# Altium footprint library my Library.PcbLib: 1247 footprints (part 72 of 78)
Each footprint in its own frame and in the unit in brackets; x right, y up, seen from the top. Pads: shape width x height; smd on the part's side, far side on the other; paste and mask are expansions set on the pad; w line width, h text height; cw(c..) or ccw(c..) is an arc to the next point about the centre after c.
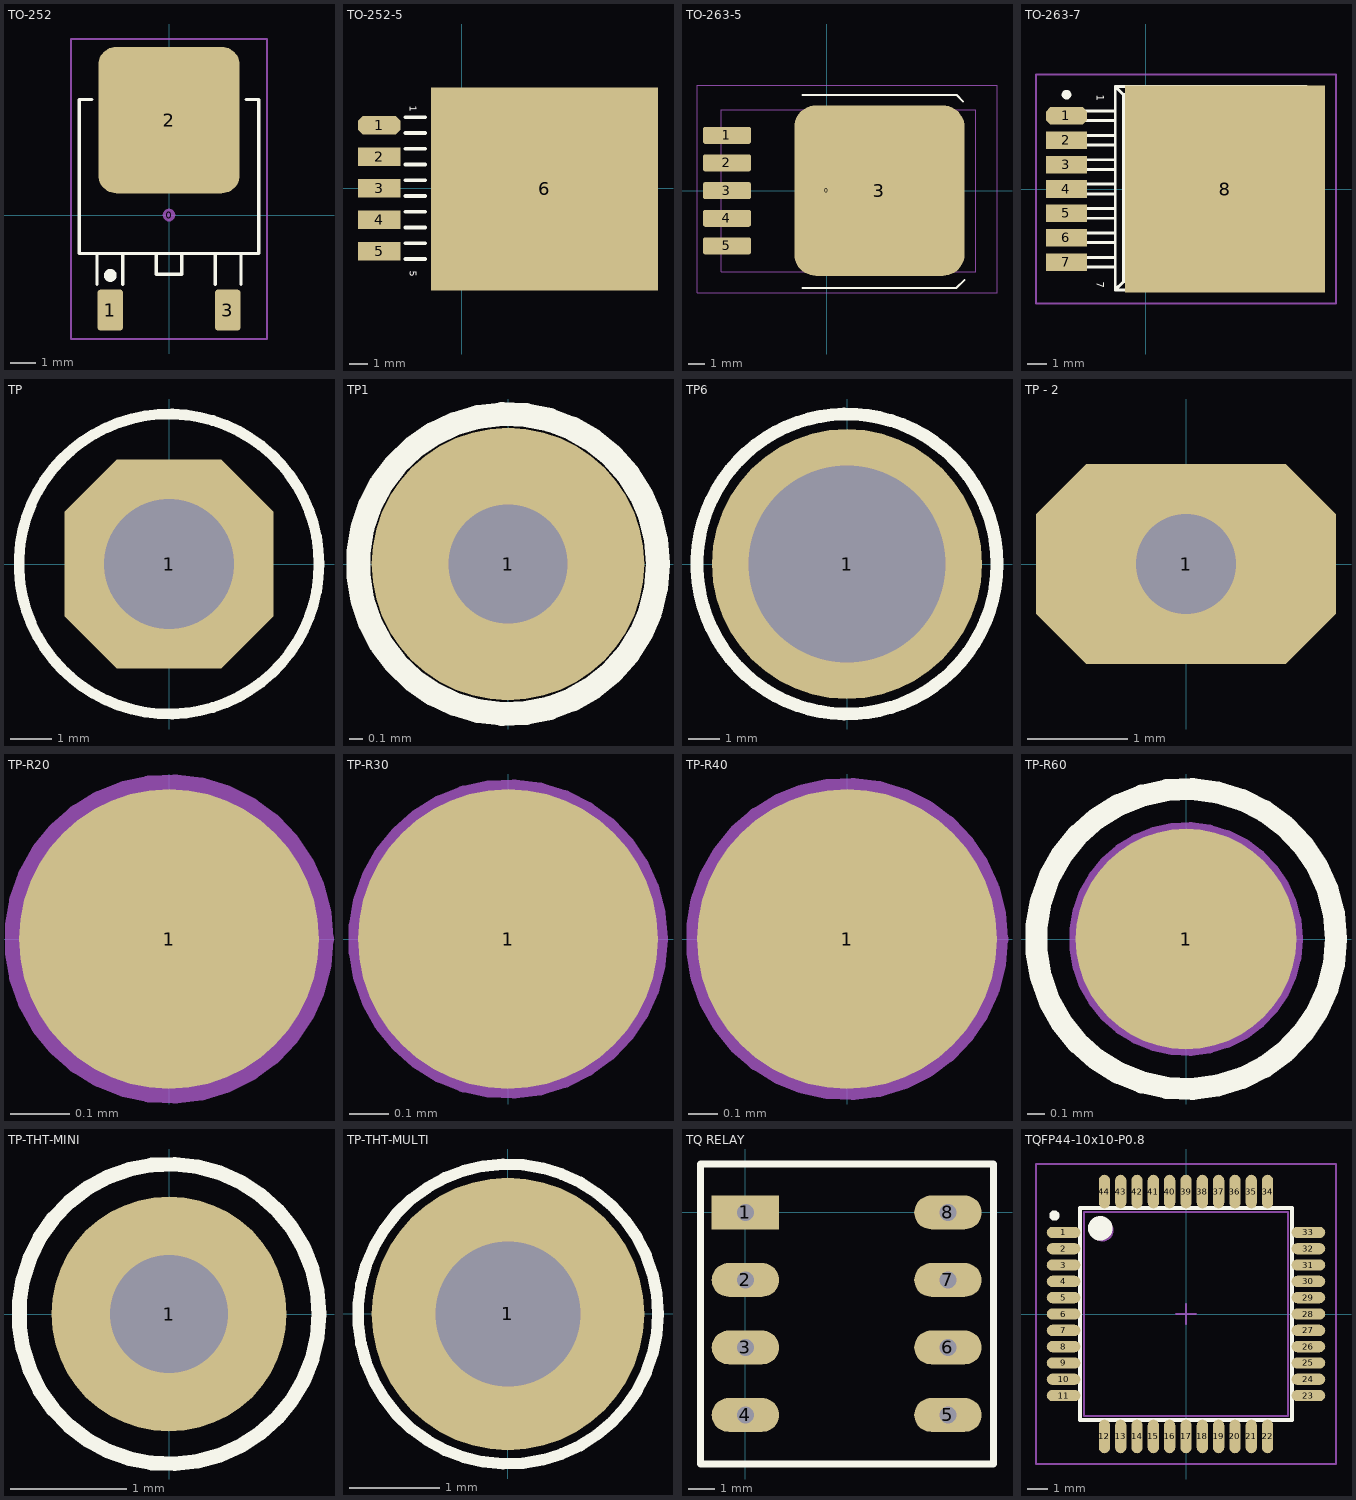
[diagram p71: the footprints below, top view; thin cyan lines are the x and y axes]

## TO-252 [mm] "D-PAK/TO-252-AA; 3 Leads (1 Cropped); Body 10.3 (inc. leads) x 6.7 mm (LxW max)"
height 2.38
pads (4):
  round 0.5 on Mech15: 0(0,0)
  rrect25% 1x1.6 smd: 1(-2.285,-3.7) 3(2.285,-3.7)
  rrect25% 5.5x5.7 smd: 2(0,3.7)
Top Overlay:
  circle w0.25: c-2.285,-2.35 r0.125
  lines w0.127: -3,4.5 -3.5,4.5 -3.5,-1.5 3.5,-1.5 3.5,4.5 3,4.5 ; -2.8,-2.7 -2.8,-1.5 -1.8,-1.5 -1.8,-2.7 ; 1.8,-2.7 1.8,-1.5 2.8,-1.5 2.8,-2.7 ; -0.5,-2.3 -0.5,-1.5 0.5,-1.5 0.5,-2.3 -0.5,-2.3
Mechanical 15:
  lines w0.076: -3.81,-4.826 -3.81,6.858 3.81,6.858 3.81,-4.826 -3.81,-4.826
3D body "DPAK.stp": height 2.31, standoff 0, extent -3.3,-3.951 3.3,5.762

## TO-252-5 [mil]
pads (6):
  oct 90x40 smd: 1(-175,133.33)
  rect 90x40 smd: 2(-175,66.67) 3(-175,0) 4(-175,-66.67) 5(-175,-133.33)
  rect 480x430 smd: 6(175,-1.67)
Top Overlay:
  lines w7.87: -120,-150 -78,-150 ; -120,-116.67 -78,-116.67 ; -120,-83.33 -78,-83.33 ; -120,-50 -78,-50 ; -120,-16.67 -78,-16.67 ; -120,16.67 -78,16.67 ; -120,50 -78,50 ; -120,83.33 -78,83.33 ; -120,116.67 -78,116.67 ; -120,150 -78,150
  text "5" at -110,-175 h15
  text "1" at -110,175 h15
Mechanical 13:
  lines w3.94: 290,-210 290,210 ; 290,-210 -50,-210 -50,210 290,210 ; 290,-210 360,-210 360,210 290,210
  lines w7.87: -50,-208.33 -33.33,-191.67 ; -50,-208.33 -50,208.33 ; -50,-208.33 291.67,-208.33 ; -50,208.33 -33.33,191.67 ; -50,208.33 291.67,208.33 ; -33.33,-191.67 -33.33,191.67 ; -33.33,-191.67 275,-191.67 ; -33.33,191.67 275,191.67 ; 275,-191.67 291.67,-208.33 ; 275,-191.67 275,191.67 ; 275,191.67 291.67,208.33 ; 291.67,-208.33 291.67,208.33 ; 291.67,-208.33 341.67,-208.33 358.33,-150 358.33,150 341.67,208.33 291.67,208.33
3D body: height 173.23, standoff 0, extent -49.98,-209.98 289.98,209.98
3D body: height 51.18, standoff 0, extent 290.02,-209.98 359.98,209.98

## TO-263-5 [mm] "D-PAK/TO-263-5; 5 Leads; Body 14.4 (inc. leads) x 10.4 mm (LxW max)"
height 4.65
pads (7):
  round 0.5 on Mech15: 0(0,0)
  rrect25% 2.95x1.05 smd: 1(-6.15,3.41) 2(-6.15,1.705) 3(-6.15,0) 4(-6.15,-1.705) 5(-6.15,-3.41)
  rrect25% 10.5x10.5 smd: 3(3.25,0)
Top Overlay:
  lines w0.127: -1.5,-6 8,-6 8.5,-5.5 ; -1.5,5.9 8,5.9 8.4,5.5
Mechanical 13:
  lines w0.076: -6.49,-5 -6.49,5 9.18,5 9.18,-5 -6.49,-5
Mechanical 15:
  lines w0.076: -8,-6.3 -8,6.5 10.5,6.5 10.5,-6.3 -8,-6.3
3D body "TO-263-5.stp": height 4.56, standoff 0, extent -6.727,-5.08 7.288,5.08

## TO-263-7 [mil] "LM2588 SIMPLE SWITCHER 5A Flyback Regulator with Shutdown"
height 179.92
pads (8):
  oct 85x36 smd: 1(-162.5,150)
  rect 85x36 smd: 2(-162.5,100) 3(-162.5,50) 4(-162.5,0) 5(-162.5,-50) 6(-162.5,-100) 7(-162.5,-150)
  rect 410x425 smd: 8(162.5,0)
Top Overlay:
  circle w9.84: c-162.5,193.33 r4.92
  lines w6: -62.5,-160 -162.5,-160 -162.5,-140 -62.5,-140 ; -62.5,-110 -162.5,-110 -162.5,-90 -62.5,-90 ; -62.5,-60 -162.5,-60 -162.5,-40 -62.5,-40 ; -62.5,-10 -162.5,-10 -162.5,10 -62.5,10 ; -62.5,40 -162.5,40 -162.5,60 -62.5,60 ; -62.5,90 -162.5,90 -162.5,110 -62.5,110 ; -62.5,140 -162.5,140 -162.5,160 -62.5,160 ; -62.5,-206.67 279.17,-206.67 ; -62.5,-206.67 -62.5,210 ; -62.5,-206.67 -45.83,-190 ; -62.5,210 279.17,210 ; -62.5,210 -45.83,193.33 ; -45.83,-190 262.5,-190 ; -45.83,-190 -45.83,193.33 ; -45.83,193.33 262.5,193.33 ; 262.5,-190 262.5,193.33 ; 262.5,-190 279.17,-206.67 ; 262.5,193.33 279.17,210 ; 279.17,-206.67 329.17,-206.67 345.83,-148.33 345.83,151.67 329.17,210 279.17,210 ; 279.17,-206.67 279.17,210
  text "1" at -100,193.33 h15
  text "7" at -100,-190 h15
Mechanical 15:
  lines w3.94: -19.69,0 19.68,0 ; 0,-19.68 0,19.68 ; -225,-235 390,-235 390,235 -225,235 -225,-235
3D body: height 183.07, standoff 0, extent -62.5,-206.67 279.17,210

## TP [mm] "TestPoint"
pads (1):
  oct 5x5 hole 3.1: 1(0,0)
Top Overlay:
  circle w0.254: c0,0 r3.588

## TP1 [mil] "Test point"
height 150
pads (1):
  round 80 hole 35: 1(0,0)
Top Overlay:
  circle w7: c0,0 r44.01
3D body "socket 1-1.stp": height 178.11, standoff -114.41, extent -50,-50 50,50

## TP6 [mm] "Jac cap 6ly"
height 3.81
pads (1):
  round 8.5 hole 6.2: 1(0,0)
Top Overlay:
  circle w0.406: c0,0 r4.724

## TP - 2 [mm] "TestPoint"
pads (1):
  oct 3x2 hole 1: 1(0,0)

## TP-R20 [mil]
pads (1):
  round 20 smd paste-30 mask+3: 1(0,0)
Mechanical 13:
  circle w1.97: c0,0 r10
3D body: height -3, standoff -5, extent -10.91,-10.98 11,10.98

## TP-R30 [mil]
pads (1):
  round 30 smd paste-30 mask+3: 1(0,0)
Mechanical 13:
  circle w1.97: c0,0 r15
3D body: height 10, standoff 0, extent -17.86,-17.96 18,17.97

## TP-R40 [mil]
pads (1):
  round 40 smd paste-40: 1(0,0)
Mechanical 13:
  circle w3: c0,0 r20
3D body: height 10, standoff 0, extent -19.84,-19.96 20,19.96

## TP-R60 [mm]
pads (1):
  round 1.27 smd paste-1.27: 1(0,0)
Top Overlay:
  circle w0.127: c0,0 r0.864
Mechanical 13:
  circle w0.076: c0,0 r0.635
3D body: height 0.25, standoff 0, extent -0.756,-0.76 0.762,0.761

## TP-THT-MINI [mil] "Thru-hole test point loop"
height 181.1
pads (1):
  round 80 / inner round 80 / far side round 90 hole 40: 1(0,0)
Top Overlay:
  circle w5: c0,0 r51
Mechanical 13:
  circle w3: c0,0 r29.94
3D body "TestPoint_Mini.stp": height 180.51, standoff -118.14, extent -48.82,-49.11 49.21,49.12

## TP-THT-MULTI [mm] "Thru-hole test point loop"
height 8.1
pads (1):
  round 3 hole 1.6: 1(0,0)
Top Overlay:
  circle w0.127: c0,0 r1.651
Mechanical 13:
  circle w0.076: c0,0 r0.76
3D body "TestPoint_Multi.stp": height 8.09, standoff -3.21, extent -1.597,-1.6 1.597,1.587

## TQ RELAY [mm]
pads (8):
  rect 2.54x1.27 hole 0.635: 1(0,0)
  oval 2.54x1.27 hole 0.635: 2(0,-2.54) 3(0,-5.08) 4(0,-7.62) 5(7.62,-7.62) 6(7.62,-5.08) 7(7.62,-2.54) 8(7.62,0)
Top Overlay:
  lines w0.254: -1.687,-9.464 -1.687,1.821 9.329,1.821 9.329,-9.464 -1.687,-9.464

## TQFP44-10x10-P0.8 [mm] "QFP, 44-Leads, Body 10x10mm, Pitch 0.8mm, IPC High Density"
height 2.44
pads (44):
  oval 1.65x0.55 smd: 1(-6,4) 2(-6,3.2) 3(-6,2.4) 4(-6,1.6) 5(-6,0.8) 6(-6,0) 7(-6,-0.8) 8(-6,-1.6) 9(-6,-2.4) 10(-6,-3.2) 11(-6,-4) 23(6,-4) 24(6,-3.2) 25(6,-2.4) 26(6,-1.6) 27(6,-0.8) 28(6,0) 29(6,0.8) 30(6,1.6) 31(6,2.4) 32(6,3.2) 33(6,4)
  oval 0.55x1.65 smd: 12(-4,-6) 13(-3.2,-6) 14(-2.4,-6) 15(-1.6,-6) 16(-0.8,-6) 17(0,-6) 18(0.8,-6) 19(1.6,-6) 20(2.4,-6) 21(3.2,-6) 22(4,-6) 34(4,6) 35(3.2,6) 36(2.4,6) 37(1.6,6) 38(0.8,6) 39(0,6) 40(-0.8,6) 41(-1.6,6) 42(-2.4,6) 43(-3.2,6) 44(-4,6)
Top Overlay:
  circle w0.6: c-4.2,4.2 r0.3
  circle w0.25: c-6.45,4.825 r0.125
  lines w0.2: -5.2,-5.2 5.2,-5.2 5.2,5.2 -5.2,5.2 -5.2,-5.2
Mechanical 13:
  circle w0.1: c-4.1,4.1 r0.5
  lines w0.1: -5,-5 5,-5 5,5 -5,5 -5,-5
Mechanical 15:
  lines w0.1: -0.5,0 0.5,0 ; 0,-0.5 0,0.5 ; -7.35,-7.35 7.35,-7.35 7.35,7.35 -7.35,7.35 -7.35,-7.35
3D body "User Library-TQFP44.STEP": height 1.15, standoff 0.08, extent -5.992,-5.994 6.008,6.006